# Altium footprint library Pcblib.PcbLib: 281 footprints (part 6 of 18)
Each footprint in its own frame and in the unit in brackets; x right, y up, seen from the top. Pads: shape width x height; smd on the part's side, far side on the other; paste and mask are expansions set on the pad; w line width, h text height; cw(c..) or ccw(c..) is an arc to the next point about the centre after c.
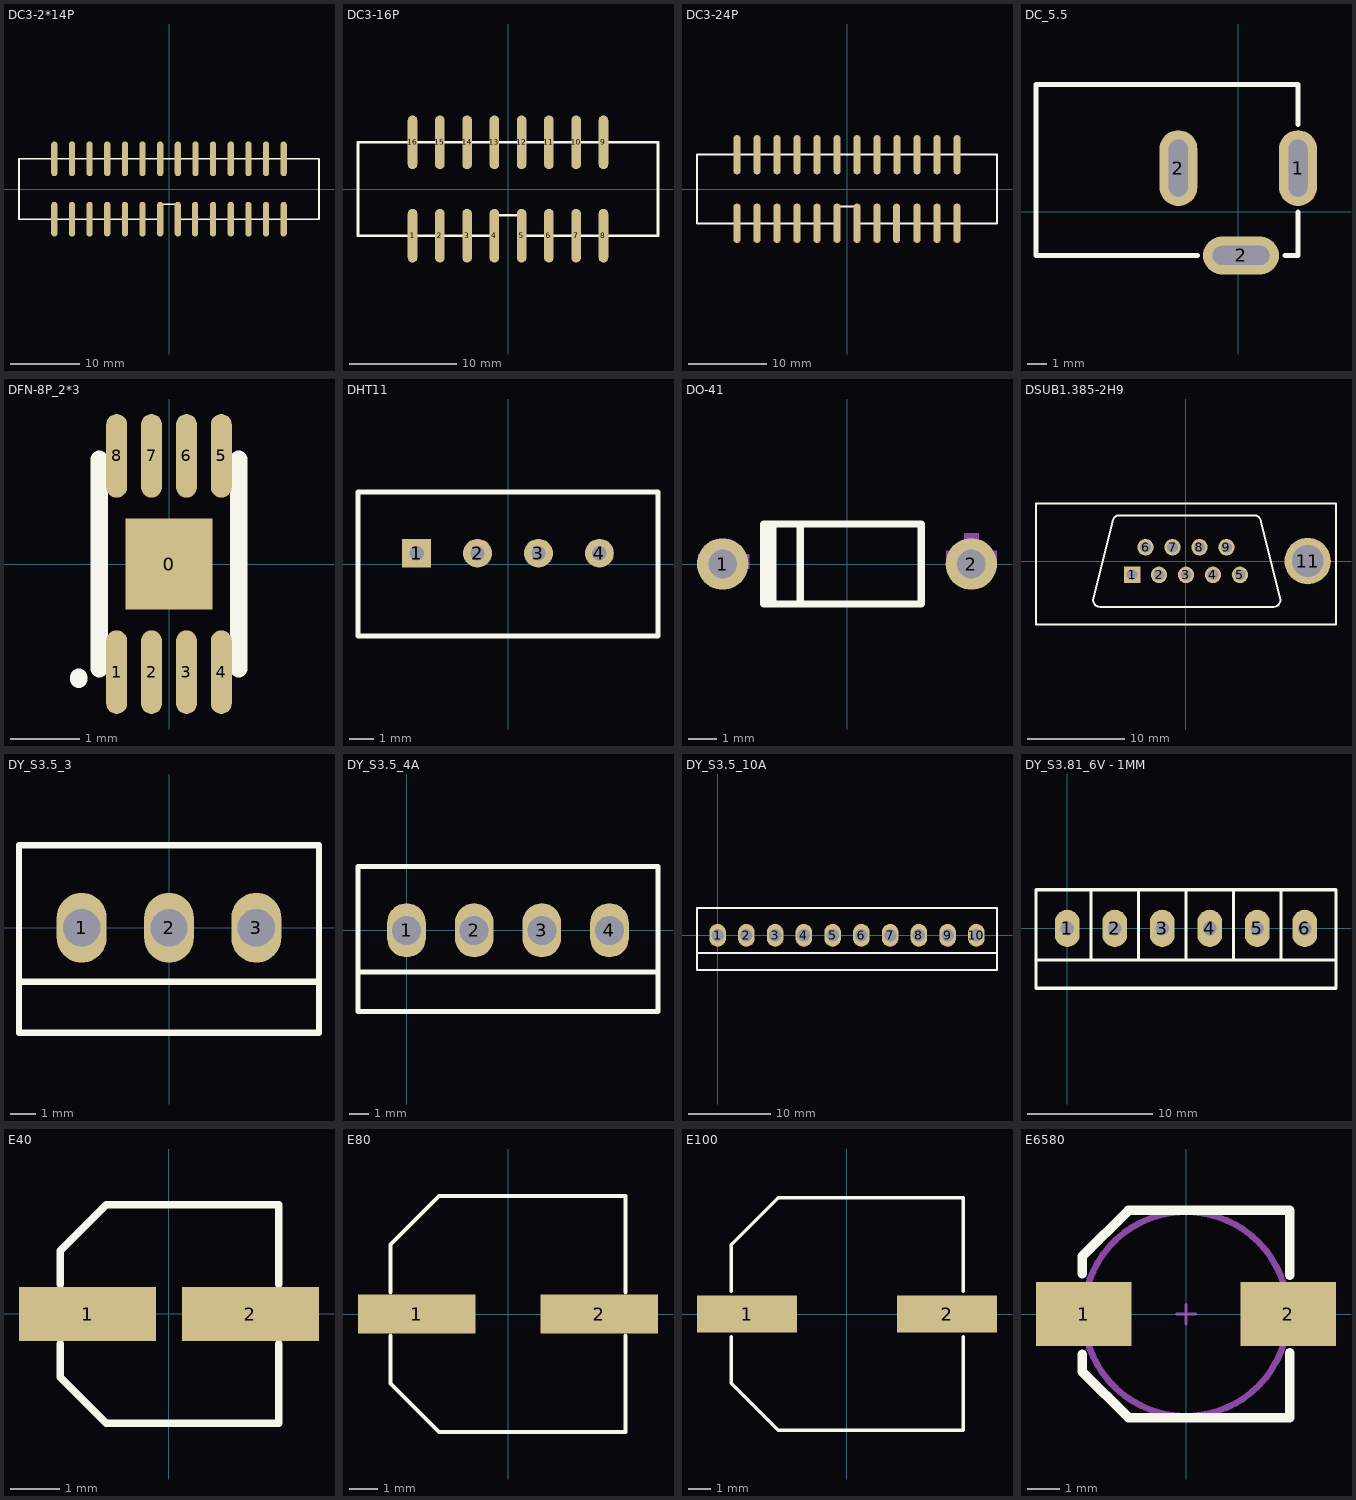
[diagram p5: the footprints below, top view; thin cyan lines are the x and y axes]

## DC3-2*14P [mm]
pads (28):
  oval 0.9x5 smd: 1(-16.51,-4.35) 2(-16.51,4.35) 3(-13.97,-4.35) 4(-13.97,4.35) 5(-11.43,-4.35) 6(-11.43,4.35) 7(-8.89,-4.35) 8(-8.89,4.35) 9(-6.35,-4.35) 10(-6.35,4.35) 11(-3.81,-4.35) 12(-3.81,4.35) 13(-1.27,-4.35) 14(-1.27,4.35) 15(1.27,-4.35) 16(1.27,4.35) 17(3.759,-4.35) 18(3.81,4.35) 19(6.35,-4.35) 20(6.35,4.35) 21(8.89,-4.35) 22(8.89,4.35) 23(11.43,-4.35) 24(11.43,4.35) 25(13.97,-4.35) 26(13.97,4.35) 27(16.51,-4.35) 28(16.51,4.35)
Top Overlay:
  lines w0.254: -21.59,-4.35 -21.59,4.35 21.59,4.35 21.59,-4.35 1.27,-4.35 1.27,-2.21 -1.27,-2.21 -1.27,-4.35 -21.59,-4.35

## DC3-16P [mm]
pads (16):
  oval 0.9x5 smd: 1(-8.89,-4.35) 2(-6.35,-4.35) 3(-3.81,-4.35) 4(-1.27,-4.35) 5(1.27,-4.35) 6(3.81,-4.35) 7(6.35,-4.35) 8(8.89,-4.35) 9(8.89,4.35) 10(6.35,4.35) 11(3.81,4.35) 12(1.27,4.35) 13(-1.27,4.35) 14(-3.81,4.35) 15(-6.35,4.35) 16(-8.89,4.35)
Top Overlay:
  lines w0.254: -13.97,-4.35 -1.27,-4.35 -1.27,-2.438 1.27,-2.438 1.27,-4.35 13.97,-4.35 13.97,4.35 -13.97,4.35 -13.97,-4.35

## DC3-24P [mm]
pads (24):
  oval 0.9x5 smd: 1(-13.97,-4.35) 2(-11.43,-4.35) 3(-8.89,-4.35) 4(-6.35,-4.35) 5(-3.81,-4.35) 6(-1.27,-4.35) 7(1.27,-4.35) 8(3.81,-4.35) 9(6.299,-4.35) 10(8.89,-4.35) 11(11.43,-4.35) 12(13.97,-4.35) 13(13.97,4.35) 14(11.43,4.35) 15(8.89,4.35) 16(6.35,4.35) 17(3.81,4.35) 18(1.27,4.35) 19(-1.27,4.35) 20(-3.81,4.35) 21(-6.35,4.35) 22(-8.89,4.35) 23(-11.43,4.35) 24(-13.97,4.35)
Top Overlay:
  lines w0.254: -19.05,-4.35 -1.27,-4.35 -1.27,-2.21 1.27,-2.21 1.27,-4.35 19.05,-4.35 19.05,4.35 -19.05,4.35 -19.05,-4.35

## DC_5.5 [mm]
pads (3):
  oval 2x4 hole 1 slot 3 at 90 deg: 1(3.15,2.3) 2(-3.15,2.3)
  oval 4x2 hole 1 slot 3 at 0 deg: 2(0.15,-2.3)
Top Overlay:
  lines w0.254: -2.15,-2.3 -10.65,-2.3 -10.65,6.7 3.15,6.7 3.15,4.6 ; 2.45,-2.3 3.15,-2.3 3.15,0

## DFN-8P_2*3 [mm]
pads (9):
  rect 1.25x1.3 smd: 0(0,0)
  oval 0.3x1.2 smd: 1(-0.75,-1.55) 2(-0.25,-1.55) 3(0.25,-1.55) 4(0.75,-1.55) 5(0.75,1.55) 6(0.25,1.55) 7(-0.25,1.55) 8(-0.75,1.55)
Top Overlay:
  lines w0.254: -1.295,-1.651 -1.295,-1.626 ; -1,-1.5 -1,1.5 ; 1,-1.5 1,1.5
3D body: height 0.8, standoff 0, extent -1,-1.5 1,1.5

## DHT11 [mm]
pads (4):
  rect 1.2x1.2 hole 0.6: 1(-3.81,0.45)
  round 1.2 hole 0.6: 2(-1.27,0.45) 3(1.27,0.45) 4(3.81,0.45)
Top Overlay:
  lines w0.2: -6.25,-3 6.25,-3 6.25,3 -6.25,3 -6.25,-3

## DO-41 [mm]
pads (2):
  round 1.8 hole 1: 1(-4.35,0) 2(4.35,0)
Top Overlay:
  lines w0.254: -2.667,-1.397 -2.921,-1.397 -2.921,1.4 -2.794,1.4 ; -2.6,-1.397 -2.794,-1.397 -2.794,1.4 ; -1.641,-1.4 -1.641,1.4 ; -2.794,1.4 -2.6,1.4 ; -2.6,1.4 2.6,1.4 2.6,-1.4 -2.6,-1.4 -2.6,1.4
Mechanical 15:
  region: -5.2,0.35 -3.422,0.35 -3.422,-0.158 -5.2,-0.158
  region: 4.1,-0.7 4.1,1.078 4.608,1.078 4.608,-0.7
  region: 3.47,0.467 5.248,0.467 5.248,-0.041 3.47,-0.041

## DSUB1.385-2H9 [mm] "Connector; D Subminiature; 9 Position; Right Angle; Pitch 1.385 mm"
height 12.75
pads (10):
  rect 1.69x1.69 hole 1.09: 1(-5.54,-1.42)
  round 1.69 hole 1.09: 2(-2.77,-1.42) 3(0,-1.42) 4(2.77,-1.42) 5(5.54,-1.42) 6(-4.155,1.42) 7(-1.385,1.42) 8(1.385,1.42) 9(4.155,1.42)
  round 4.76 hole 3.26: 11(12.495,0)
Top Overlay:
  lines w0.2: -15.4,-6.5 -15.4,5.9 15.4,5.9 15.4,-6.5 -15.4,-6.5 ; -9.542,-4 ccw(c-8.847,-4) -8.847,-4.695 9.003,-4.695 ccw(c9.003,-4) 9.698,-4 7.698,4 ccw(c7.003,4) 7.003,4.695 -6.847,4.695 ccw(c-6.847,4) -7.542,4 -9.542,-4

## DY_S3.5_3 [mm]
height 5.6
pads (3):
  oval 2x2.8 hole 1.5: 1(-3.5,0) 2(0,0) 3(3.5,0)
Top Overlay:
  lines w0.254: -6.01,-2.159 6.01,-2.159 ; -6.01,-4.2 -6.01,3.3 6.01,3.3 6.01,-4.2 -6.01,-4.2

## DY_S3.5_4A [mm]
height 5.6
pads (4):
  oval 2x2.8 hole 1.5: 1(0,0) 2(3.5,0) 3(7,0) 4(10.5,0)
Top Overlay:
  lines w0.254: -2.51,-2.159 13.01,-2.159 ; -2.51,-4.2 13.01,-4.2 13.01,3.3 -2.51,3.3 -2.51,-4.2

## DY_S3.5_10A [mm]
height 5.6
pads (10):
  oval 2x2.8 hole 1.5: 1(0,0) 2(3.5,0) 3(7,0) 4(10.5,0) 5(14,0) 6(17.5,0) 7(21,0) 8(24.5,0) 9(28,0) 10(31.5,0)
Top Overlay:
  lines w0.254: -2.51,-2.159 34.01,-2.159 ; -2.51,-4.2 -2.51,3.3 34.01,3.3 34.01,-4.2 -2.51,-4.2

## DY_S3.81_6V - 1MM [mm]
height 5.6
pads (6):
  oval 2x3 hole 1.1: 1(0,0) 2(3.81,0) 3(7.62,0) 4(11.43,0) 5(15.24,0) 6(19.05,0)
Top Overlay:
  lines w0.254: -2.51,-2.54 21.56,-2.54 ; 1.905,-2.54 1.905,3.09 ; 5.715,-2.54 5.715,3.07 ; 9.525,-2.54 9.525,3.04 ; 13.335,-2.54 13.335,3.06 ; 17.145,-2.54 17.145,3.06 ; 21.56,3.07 21.56,-4.8 -2.51,-4.8 -2.51,3.1 21.56,3.1

## E40 [mm]
pads (2):
  rect 2.8x1.1 smd: 1(-1.66,0) 2(1.66,0)
Top Overlay:
  lines w0.152: -2.217,-0.607 -2.217,-1.29 -1.28,-2.226 2.236,-2.226 2.236,-0.607 ; -2.217,0.607 -2.217,1.29 -1.28,2.226 2.236,2.226 2.236,0.607

## E80 [mm]
pads (2):
  rect 4.2x1.4 smd: 1(-3.267,0) 2(3.267,0)
Top Overlay:
  lines w0.152: -4.201,-0.782 -4.201,-2.49 -2.465,-4.226 4.201,-4.226 4.201,-0.782 ; -4.201,0.782 -4.201,2.49 -2.465,4.226 4.201,4.226 4.201,0.782

## E100 [mm]
pads (2):
  rect 4.5x1.65 smd: 1(-4.5,0) 2(4.5,0)
Top Overlay:
  lines w0.152: -5.207,-1.016 -5.207,-3.109 -3.09,-5.226 5.226,-5.226 5.226,-1.016 ; -5.207,1.016 -5.207,3.109 -3.09,5.226 5.226,5.226 5.226,1.016
Mechanical 15:
  region: 4.841,0.155 4.841,-0.155 3.605,-0.155 3.605,0.155
  region: -4.841,0.155 -4.841,-0.155 -3.605,-0.155 -3.605,0.155

## E6580 [mm]
height 8
pads (2):
  rect 3x2 smd: 1(-3.2,0) 2(3.2,0)
Top Overlay:
  lines w0.305: -3.25,-1.813 -3.25,-1.27 ; -3.25,1.27 -3.25,1.813 ; -3.237,-1.813 -1.8,-3.25 3.25,-3.25 3.25,-1.218 ; -3.237,1.813 -1.8,3.25 3.25,3.25 3.25,1.218
Mechanical 13:
  circle w0.2: c0,0 r3.2
Mechanical 15:
  lines w0.1: -0.295,0 0.305,0 ; 0,-0.305 0,0.295
3D body: height 0.4, standoff 0, extent -3.237,-3.25 3.302,3.25